# Altium footprint library 元件1.PcbLib: 420 footprints (part 20 of 27)
Each footprint in its own frame and in the unit in brackets; x right, y up, seen from the top. Pads: shape width x height; smd on the part's side, far side on the other; paste and mask are expansions set on the pad; w line width, h text height; cw(c..) or ccw(c..) is an arc to the next point about the centre after c.
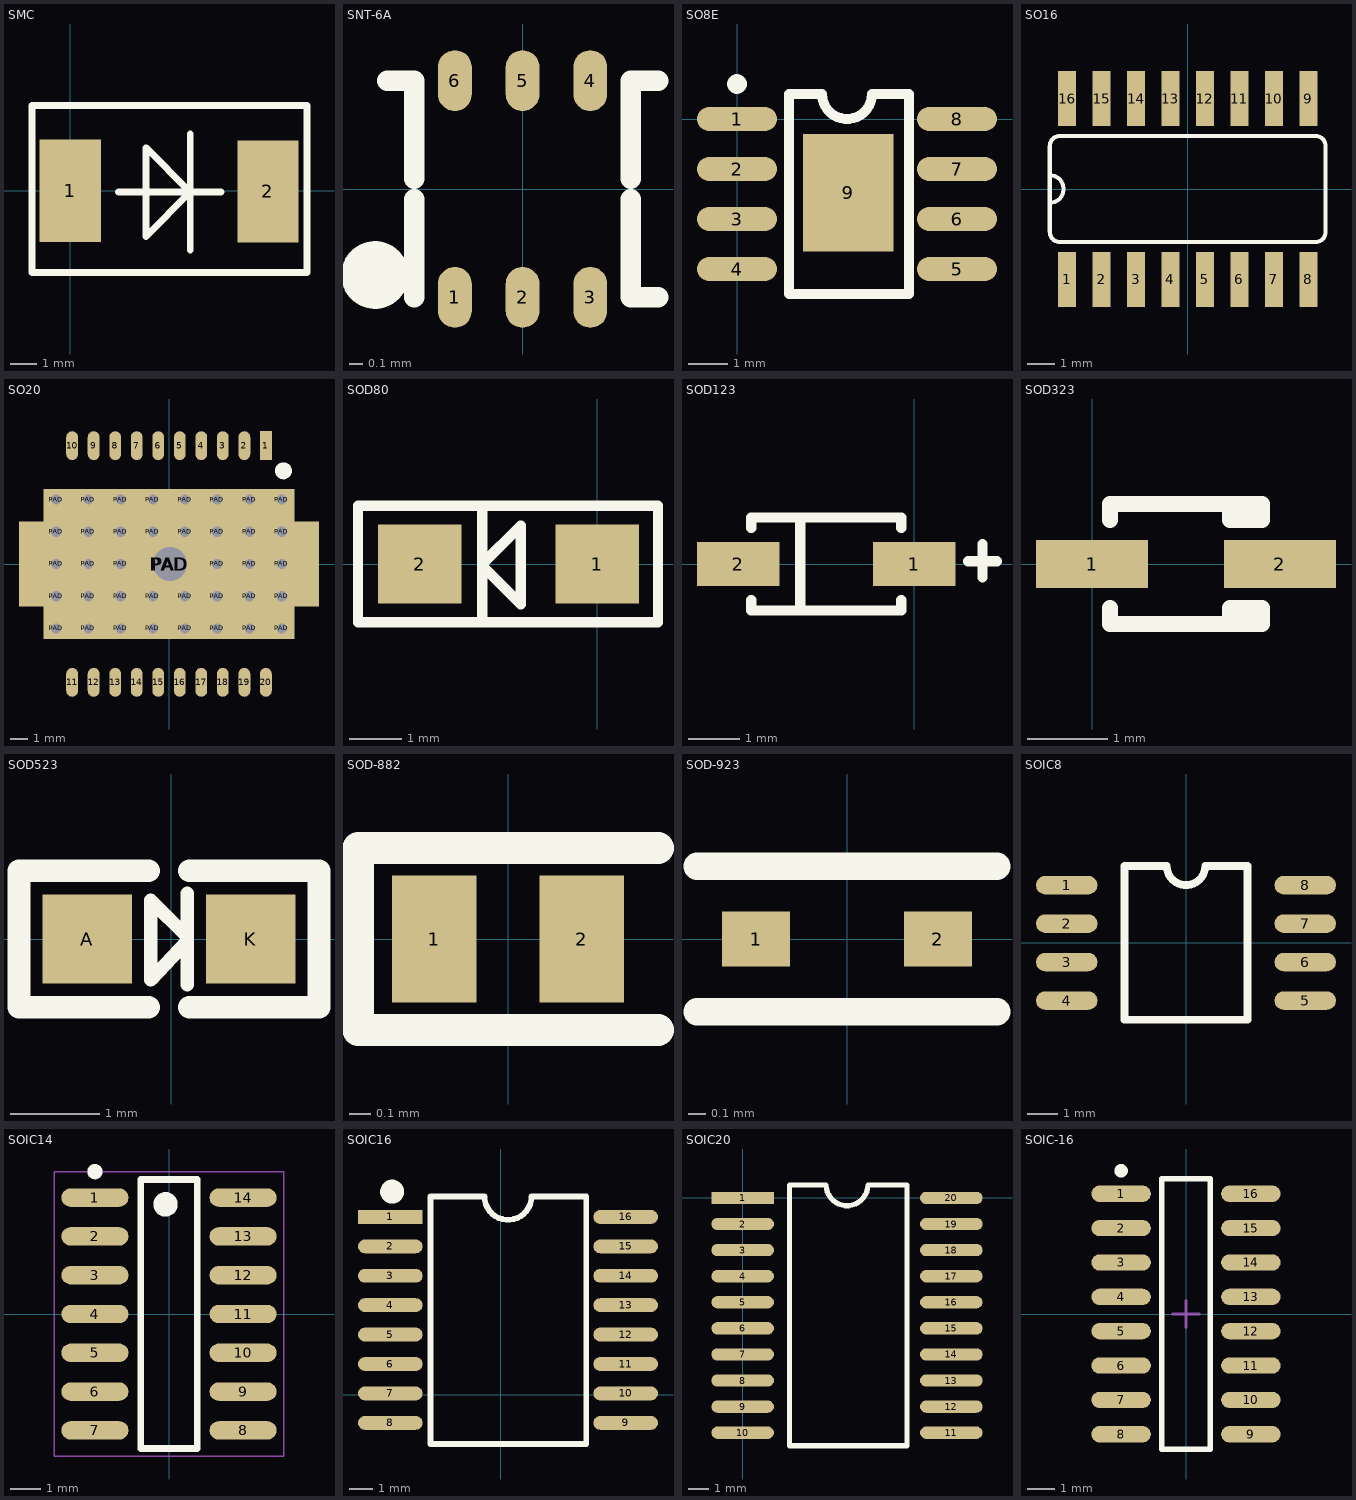
[diagram p19: the footprints below, top view; thin cyan lines are the x and y axes]

## SMC [mil] "DO-214AB(2114)"
pads (2):
  rect 90x149.84 smd: 1(0,0)
  rect 90x149.63 smd: 2(290,-1)
Top Overlay:
  lines w10: 71,-2 221,-2 ; 176,-87 176,83 ; -56,-120 -56,125 347,125 347,-120 -56,-120 ; 111,-67 176,-2 111,63 111,-67
3D body "DO-214AB.STEP": height 106.3, standoff 0, extent -14.84,-117.09 304.84,127

## SNT-6A [mm]
height 0.5
pads (6):
  oval 0.25x0.45 smd: 1(-0.5,-0.8) 2(0,-0.8) 3(0.5,-0.8) 4(0.5,0.8) 5(0,0.8) 6(-0.5,0.8)
Top Overlay:
  circle w0.25: c-1.09,-0.635 r0.125
  lines w0.152: -1,0.8 -0.8,0.8 -0.8,0.075 ; -0.8,-0.8 -0.8,-0.075 ; 0.8,-0.075 0.8,-0.8 1,-0.8 ; 0.8,0.075 0.8,0.8 1,0.8
3D body "SNT-6A.STEP": height 0.5, standoff 0, extent -0.799,-0.898 0.799,0.9

## SO8E [mil]
pads (9):
  oval 80x24 smd: 1(0,0) 2(0,-50) 3(0,-100) 4(0,-150) 5(220,-150) 6(220,-100) 7(220,-50) 8(220,0)
  rect 90.55x117.72 smd: 9(111.23,-73.8)
Top Overlay:
  circle w9.84: c0,35 r4.92
  lines w10: 52,-175 172,-175 172,25 135,25 cw(c110,25) 85,25 52,25 52,-175
3D body "SOP8.STEP": height 62.99, standoff 0, extent -7.7,-172.62 230.17,25.02

## SO16 [mil]
pads (16):
  rect 26x80 smd: 1(-175,-131) 2(-125,-131) 3(-75,-131) 4(-25,-131) 5(25,-131) 6(75,-131) 7(125,-131) 8(175,-131) 9(175,131) 10(125,131) 11(75,131) 12(25,131) 13(-25,131) 14(-75,131) 15(-125,131) 16(-175,131)
Top Overlay:
  lines w6: -200,-20 ccw(c-200,0) -200,20 ; -200,-20 -200,-62 ccw(c-185,-62) -185,-77 185,-77 ccw(c185,-62) 200,-62 200,62 ccw(c185,62) 185,77 -185,77 ccw(c-185,62) -200,62 -200,20 ; -200,-20 -200,20
3D body "User Library-SOP16_208mil (5_3mm).STEP": height 70.87, standoff -7.87, extent -200.78,-155.93 200.79,155.92

## SO20 [mm]
pads (63):
  rect 0.7x1.7 smd mask+0.07: 1(5.715,6.985)
  oval 0.7x1.7 smd mask+0.07: 2(4.445,6.985) 3(3.175,6.985) 4(1.905,6.985) 5(0.635,6.985) 6(-0.635,6.985) 7(-1.905,6.985) 8(-3.175,6.985) 9(-4.445,6.985) 10(-5.715,6.985) 11(-5.715,-6.985) 12(-4.445,-6.985) 13(-3.175,-6.985) 14(-1.905,-6.985) 15(-0.635,-6.985) 16(0.635,-6.985) 17(1.905,-6.985) 18(3.175,-6.985) 19(4.445,-6.985) 20(5.715,-6.985)
  round 0.9 hole 0.6 mask+0.06: PAD(-6.65,-3.8) PAD(-6.65,-1.9) PAD(-6.65,0) PAD(-6.65,1.9) PAD(-6.65,3.8) PAD(-4.75,-3.8) PAD(-4.75,-1.9) PAD(-4.75,0) PAD(-4.75,1.9) PAD(-4.75,3.8) PAD(-2.85,-3.8) PAD(-2.85,-1.9) PAD(-2.85,0) PAD(-2.85,1.9) PAD(-2.85,3.8) PAD(-0.95,-3.8) PAD(-0.95,-1.9) PAD(-0.95,1.9) PAD(-0.95,3.8) PAD(0.95,-3.8) PAD(0.95,-1.9) PAD(0.95,1.9) PAD(0.95,3.8) PAD(2.85,-3.8) PAD(2.85,-1.9) PAD(2.85,0) PAD(2.85,1.9) PAD(2.85,3.8) PAD(4.75,-3.8) PAD(4.75,-1.9) PAD(4.75,0) PAD(4.75,1.9) PAD(4.75,3.8) PAD(6.65,-3.8) PAD(6.65,-1.9) PAD(6.65,0) PAD(6.65,1.9) PAD(6.65,3.8)
  rect 17.7x5 smd mask+0.06: PAD(0,0)
  rect 17.7x3 smd mask+0.06: PAD(0,0)
  rect 9.8x6.2 smd mask+0.06: PAD(0,0)
  rect 14.8x8.828 smd mask+0.06: PAD(0,0)
  round 2.5 hole 2 mask+0.06: PAD(0.069,0)
Top Overlay:
  circle w0.5: c6.75,5.5 r0.25
3D body "User Library-PowerSO20.STEP": height 3.6, standoff 0, extent -8,-7.2 8,7.2

## SOD80 [mm] "LL34"
pads (2):
  rect 1.6x1.524 smd: 1(0,0) 2(-3.4,0)
Top Overlay:
  lines w0.2: -4.588,1.092 -4.588,-1.118 1.168,-1.118 1.168,1.067 ; -4.588,1.118 1.168,1.118 ; -2.2,-1.118 -2.2,1.118 ; -2.2,-0.035 -1.463,-0.772 -1.463,0.737 -2.2,0 -2.2,-0.035
3D body "SOD-80.STEP": height 1.5, standoff 0, extent -3.528,-0.75 -0.028,0.75

## SOD123 [mm] "1206"
pads (2):
  rect 1.6x0.85 smd: 1(0,0) 2(-3.4,0)
Top Overlay:
  lines w0.2: -3.15,-0.7 -3.15,-0.9 -0.25,-0.9 -0.25,-0.7 ; -3.15,0.7 -3.15,0.9 -0.25,0.9 -0.25,0.7 ; -2.2,-0.9 -2.2,0.9 ; 1.043,0.051 1.602,0.051 ; 1.323,-0.254 1.323,0.381
3D body "User Library-SOD-123_DiodesInc.STEP": height 1.42, standoff -0.03, extent -3.596,-0.853 0.254,0.847

## SOD323 [mm] "0805"
pads (2):
  rect 1.4x0.6 smd: 1(0,0) 2(2.35,0)
Top Overlay:
  lines w0.2: 0.225,-0.55 0.225,-0.75 2.125,-0.75 2.125,-0.55 1.725,-0.55 1.725,-0.75 ; 0.225,0.55 0.225,0.75 2.125,0.75 2.125,0.55 1.725,0.55 1.725,0.75
3D body "SOD-323.STEP": height 1, standoff 0, extent -0.169,-0.667 2.431,0.633

## SOD523 [mm] "0603"
pads (2):
  rect 1x1 smd: A(-0.94,0) K(0.889,0)
Top Overlay:
  lines w0.152: 0.178,-0.508 0.178,0.508 ; 0.178,-0.025 -0.229,-0.457 -0.229,0.432 0.178,0.025
  lines w0.254: -0.254,-0.762 -1.702,-0.762 -1.702,0.762 -0.254,0.762 ; 0.203,-0.762 1.651,-0.762 1.651,0.762 0.203,0.762
3D body "SOD-523.STEP": height 0.65, standoff 0, extent -0.813,-0.381 0.787,0.419

## SOD-882 [mm]
height 0.5
pads (2):
  rect 0.4x0.6 smd: 1(-0.35,0) 2(0.35,0)
Top Overlay:
  lines w0.152: 0.711,-0.432 -0.711,-0.432 -0.711,0.432 0.711,0.432
3D body "SOD-882.STEP": height 0.5, standoff 0, extent -0.52,-0.32 0.52,0.32

## SOD-923 [mil]
pads (2):
  rect 15x12 smd: 1(-20,0) 2(20,0)
Top Overlay:
  lines w6: -33,-16 33,-16 ; -33,16 33,16
3D body "SOD-923.STEP": height 15.75, standoff 0, extent -20.87,-12.7 20.47,12.8

## SOIC8 [mil]
pads (8):
  oval 80x24 smd: 1(-155,75) 2(-155,25) 3(-155,-25) 4(-155,-75) 5(155,-75) 6(155,-25) 7(155,25) 8(155,75)
Top Overlay:
  lines w10: -80,-100 -80,100 -25,100 ccw(c0,100) 25,100 80,100 80,-100 -80,-100
3D body "SOIC8.STEP": height 90.55, standoff -0.78, extent -167.2,-105.9 163.21,105.91

## SOIC14 [mm]
height 1.75
pads (14):
  oval 2.2x0.6 smd: 1(-2.425,3.81) 2(-2.425,2.54) 3(-2.425,1.27) 4(-2.425,0) 5(-2.425,-1.27) 6(-2.425,-2.54) 7(-2.425,-3.81) 8(2.425,-3.81) 9(2.425,-2.54) 10(2.425,-1.27) 11(2.425,0) 12(2.425,1.27) 13(2.425,2.54) 14(2.425,3.81)
Top Overlay:
  circle w0.4: c-0.115,3.59 r0.2
  circle w0.25: c-2.425,4.66 r0.125
  lines w0.22: -0.925,-4.4 0.925,-4.4 0.925,4.4 -0.925,4.4 -0.925,-4.4
Mechanical 15:
  lines w0.05: -3.75,-4.65 3.75,-4.65 3.75,4.65 -3.75,4.65 -3.75,-4.65
3D body "SOIC14.STEP": height 1.75, standoff 0, extent -2.896,-4.237 2.904,4.293

## SOIC16 [mil]
pads (16):
  rect 110x23.62 smd: 1(-188,302)
  oval 110x23.62 smd: 2(-188,252) 3(-188,202) 4(-188,152) 5(-188,102) 6(-188,52) 7(-188,2) 8(-188,-48) 9(212,-48) 10(212,2) 11(212,52) 12(212,102) 13(212,152) 14(212,202) 15(212,252) 16(212,302)
Top Overlay:
  lines w10: -120,335 -120,-84 145,-84 145,335 ; -120,337 -28,337 ccw(c12,337) 52,337 145,337
  lines w20: -195.28,345.79 ccw(c-185,345) -194.93,347.77
3D body "User Library-SOIC16_Wide_JEDEC_MS-013AA.step": height 108.23, standoff 3.9, extent -194.25,-79.69 224.25,333.69

## SOIC20 [mm]
pads (20):
  rect 3.048x0.6 smd: 1(0,0)
  oval 3.048x0.6 smd: 2(0,-1.27) 3(0,-2.54) 4(0,-3.81) 5(0,-5.08) 6(0,-6.35) 7(0,-7.62) 8(0,-8.89) 9(0,-10.16) 10(0,-11.43) 11(10.16,-11.43) 12(10.16,-10.16) 13(10.16,-8.89) 14(10.16,-7.62) 15(10.16,-6.35) 16(10.16,-5.08) 17(10.16,-3.81) 18(10.16,-2.54) 19(10.16,-1.27) 20(10.16,0)
Top Overlay:
  lines w0.254: 2.286,-12.065 8.001,-12.065 8.001,0.635 6.096,0.635 cw(c5.08,0.635) 4.064,0.635 2.286,0.635 2.286,-12.065
3D body "User Library-SOIC20-300.STEP": height 2.65, standoff 0, extent -0.045,-12.09 10.255,0.71

## SOIC-16 [mm] "SOIC, 16-Leads, Body 9.90x3.90mm, Pitch 1.27mm, IPC Medium Density"
height 1.75
pads (16):
  oval 2.2x0.6 smd: 1(-2.4,4.445) 2(-2.4,3.175) 3(-2.4,1.905) 4(-2.4,0.635) 5(-2.4,-0.635) 6(-2.4,-1.905) 7(-2.4,-3.175) 8(-2.4,-4.445) 9(2.4,-4.445) 10(2.4,-3.175) 11(2.4,-1.905) 12(2.4,-0.635) 13(2.4,0.635) 14(2.4,1.905) 15(2.4,3.175) 16(2.4,4.445)
Top Overlay:
  circle w0.25: c-2.4,5.295 r0.125
  lines w0.2: -0.9,-5 -0.9,5 0.9,5 0.9,-5 -0.9,-5
Mechanical 15:
  lines w0.1: -0.5,0 0.5,0 ; 0,-0.5 0,0.5
3D body "User Library-SOIC-16-1.STEP": height 1.4, standoff 0, extent -3,-4.95 3,4.95